# Altium footprint library PCB_Connector.PcbLib: 65 footprints (part 2 of 5)
Each footprint in its own frame and in the unit in brackets; x right, y up, seen from the top. Pads: shape width x height; smd on the part's side, far side on the other; paste and mask are expansions set on the pad; w line width, h text height; cw(c..) or ccw(c..) is an arc to the next point about the centre after c.
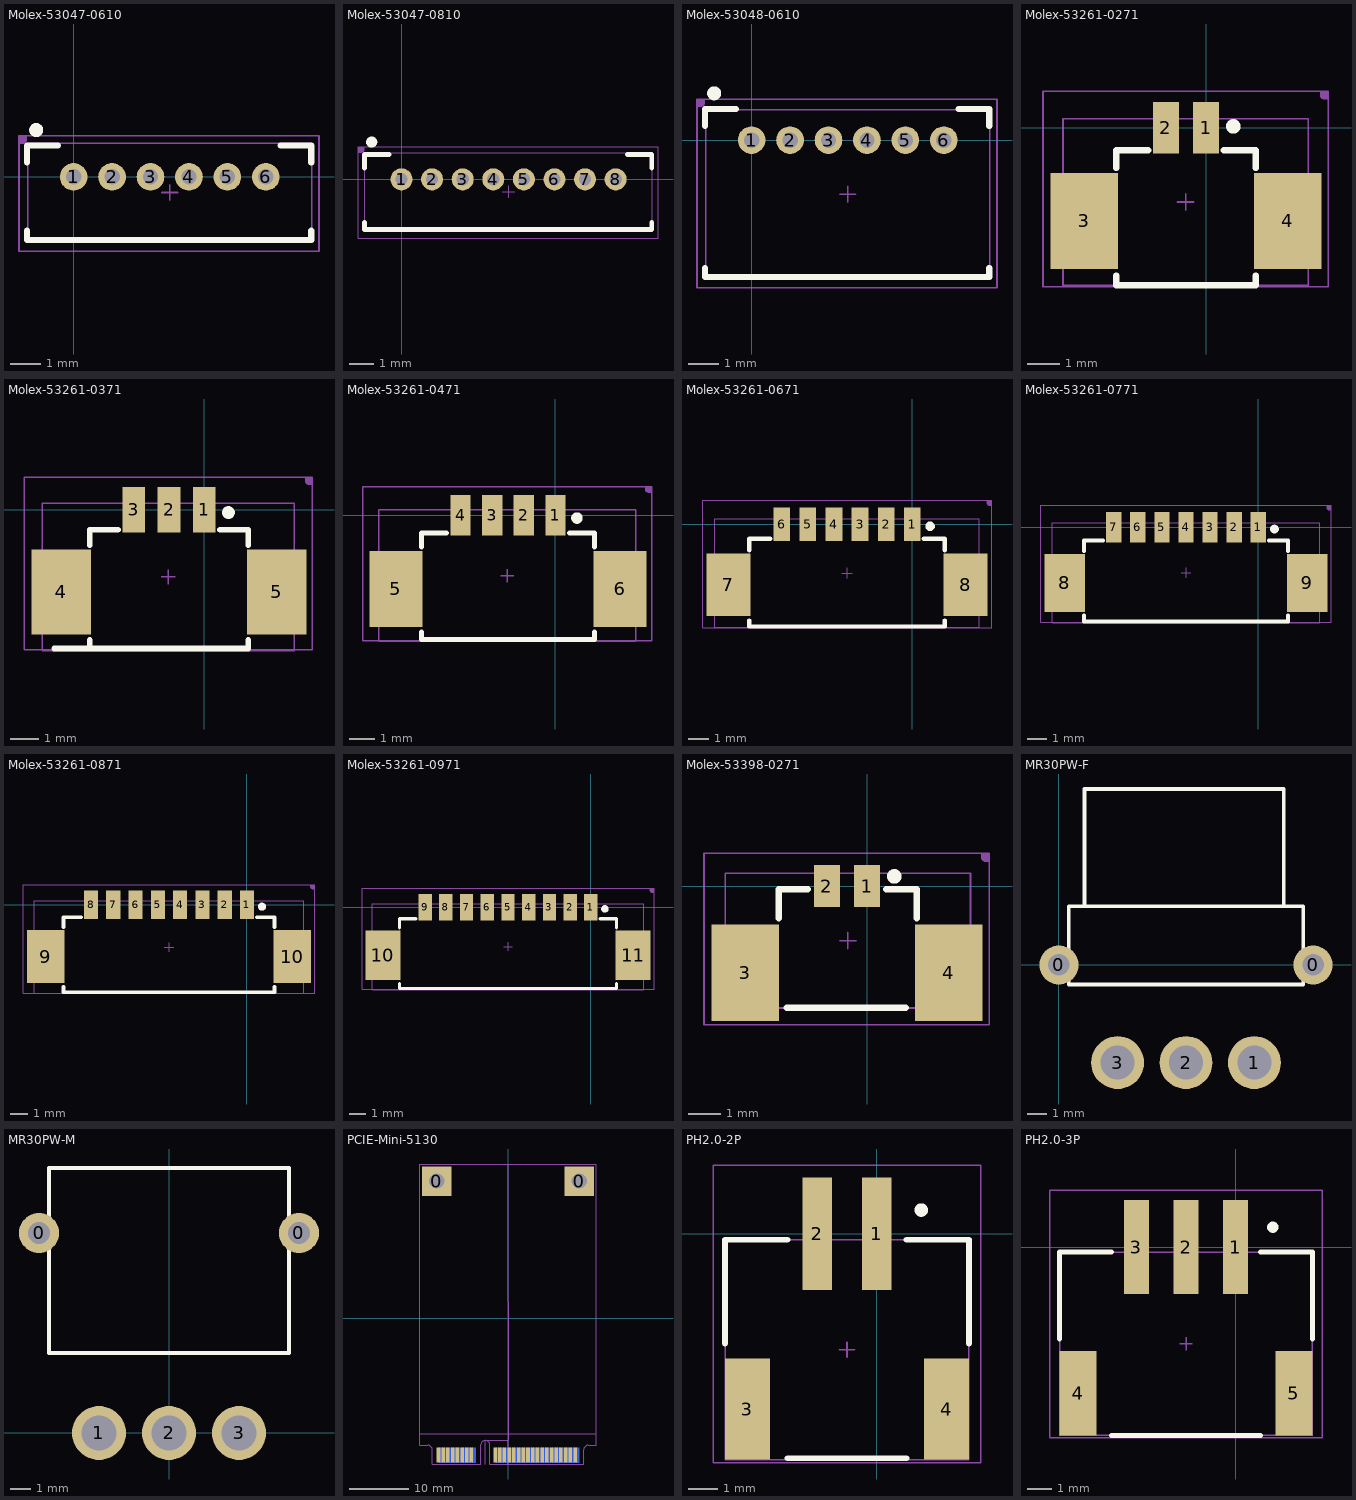
[diagram p1: the footprints below, top view; thin cyan lines are the x and y axes]

## Molex-53047-0610 [mm] "立式1.25mm Pitch PicoBlade Header"
height 3.4
pads (6):
  round 0.9 hole 0.5: 1(0,0) 2(1.25,0) 3(2.5,0) 4(3.75,0) 5(5,0) 6(6.25,0)
Top Overlay:
  circle w0.254: c-1.218,1.524 r0.1
  lines w0.2: -1.516,-1.755 -1.516,-2.055 5.334,-2.055 7.727,-2.055 7.727,-1.755 ; -1.516,0.466 -1.516,1.016 -0.516,1.016 ; 6.727,1.016 7.727,1.016 7.727,0.466
Top Assembly (Mech13):
  lines w0.051: 2.871,-0.508 3.379,-0.508 ; 3.125,-0.762 3.125,-0.254 ; -1.5,-2.108 -1.5,1.092 7.75,1.092 7.75,-2.108 -1.5,-2.108
Top Component:
  region: -1.778,1.333 -1.524,1.333 -1.524,1.206 -1.524,1.181 -1.543,1.135 -1.579,1.099 -1.626,1.079 -1.651,1.079 -1.778,1.079
  lines w0.051: -1.778,-2.413 7.981,-2.413 7.981,1.333 -1.778,1.333 -1.778,-2.413
  text ".Designator" at 1.651,-0.762 h2.03
3D body "530470610.stp": height 4.18, standoff -2.32, extent -1.5,-2.108 7.75,1.092

## Molex-53047-0810 [mm] "立式1.25mm Pitch PicoBlade Header"
height 3.4
pads (8):
  round 0.9 hole 0.5: 1(0,0) 2(1.25,0) 3(2.5,0) 4(3.75,0) 5(5,0) 6(6.25,0) 7(7.5,0) 8(8.75,0)
Top Overlay:
  circle w0.254: c-1.218,1.524 r0.1
  lines w0.2: -1.516,-1.755 -1.516,-2.055 10.227,-2.055 10.227,-1.755 ; -1.516,0.466 -1.516,1.016 -0.516,1.016 ; 9.227,1.016 10.227,1.016 10.227,0.466
Top Assembly (Mech13):
  lines w0.051: 4.121,-0.508 4.629,-0.508 ; 4.375,-0.762 4.375,-0.254 ; -1.5,-2.108 -1.5,1.092 10.25,1.092 10.25,-2.108 -1.5,-2.108
Top Component:
  region: -1.778,1.333 -1.524,1.333 -1.524,1.206 -1.524,1.181 -1.543,1.135 -1.579,1.099 -1.626,1.079 -1.651,1.079 -1.778,1.079
  lines w0.051: -1.778,-2.413 10.481,-2.413 10.481,1.333 -1.778,1.333 -1.778,-2.413
  text ".Designator" at 3.556,-0.864 h2.03
3D body "530470810.stp": height 4.18, standoff -2.32, extent -1.5,-2.108 10.25,1.092

## Molex-53048-0610 [mm] "卧式1.25mm Pitch PicoBlade Header"
height 3.4
pads (6):
  round 0.9 hole 0.5: 1(0,0) 2(1.25,0) 3(2.5,0) 4(3.75,0) 5(5,0) 6(6.25,0)
Top Overlay:
  circle w0.254: c-1.218,1.524 r0.1
  lines w0.2: -1.516,-4.155 -1.516,-4.455 5.334,-4.455 7.727,-4.455 7.727,-4.155 ; -1.516,0.466 -1.516,1.016 -0.516,1.016 ; 6.727,1.016 7.727,1.016 7.727,0.466
Top Assembly (Mech13):
  lines w0.051: 2.871,-1.758 3.379,-1.758 ; 3.125,-2.012 3.125,-1.504 ; -1.5,-4.508 7.75,-4.508 7.75,0.992 -1.5,0.992 -1.5,-4.508
Top Component:
  region: -1.778,1.333 -1.524,1.333 -1.524,1.206 -1.524,1.181 -1.543,1.135 -1.579,1.099 -1.626,1.079 -1.651,1.079 -1.778,1.079
  lines w0.051: -1.778,-4.8 -1.778,1.333 7.981,1.333 7.981,-4.8 -1.778,-4.8
  text ".Designator" at 2,-2 h2.03
3D body "530480610.stp": height 3.6, standoff -2.2, extent -1.5,-4.508 7.75,0.992

## Molex-53261-0271 [mm] "卧式1.25mm Pitch PicoBlade Header"
height 3.4
pads (4):
  rect 0.8x1.6 smd: 1(0,0) 2(-1.25,0)
  rect 2.1x3 smd: 3(-3.8,-2.9) 4(2.55,-2.9)
Top Overlay:
  circle w0.254: c0.85,0.046 r0.1
  lines w0.2: -2.8,-4.6 -2.8,-4.9 1.55,-4.9 1.55,-4.6 ; -2.8,-1.25 -2.8,-0.7 -1.8,-0.7 ; 0.55,-0.7 1.55,-0.7 1.55,-1.25
Top Assembly (Mech13):
  lines w0.051: -0.889,-2.312 -0.381,-2.312 ; -0.635,-2.566 -0.635,-2.058 ; -4.46,-4.912 3.19,-4.912 3.19,0.288 -4.46,0.288 -4.46,-4.912
Top Component:
  region: 3.81,1.143 3.81,0.889 3.683,0.889 3.658,0.889 3.611,0.908 3.575,0.944 3.556,0.991 3.556,1.016 3.556,1.143
  lines w0.051: -5.08,-4.953 -5.08,1.143 3.81,1.143 3.81,-4.953 -5.08,-4.953
  text ".Designator" at -1.905,-2.82 h2.03
3D body "MOLEX-53261-0271.stp": height 3.4, standoff 0, extent -4.46,-4.912 3.19,0.288

## Molex-53261-0371 [mm] "卧式1.25mm Pitch PicoBlade Header"
height 3.4
pads (5):
  rect 0.8x1.6 smd: 1(0,0) 2(-1.25,0) 3(-2.5,0)
  rect 2.1x3 smd: 4(-5.05,-2.9) 5(2.55,-2.9)
Top Overlay:
  circle w0.254: c0.85,-0.1 r0.1
  lines w0.2: -5.3,-4.9 1.55,-4.9 1.55,-4.6 ; -4.05,-4.9 -4.05,-4.6 ; -4.05,-1.25 -4.05,-0.7 -3.05,-0.7 ; 0.55,-0.7 1.55,-0.7 1.55,-1.25
Top Assembly (Mech13):
  lines w0.051: -1.529,-2.375 -1.021,-2.375 ; -1.275,-2.629 -1.275,-2.121 ; -5.725,-4.975 3.175,-4.975 3.175,0.225 -5.725,0.225 -5.725,-4.975
Top Component:
  region: 3.81,1.143 3.81,0.889 3.683,0.889 3.658,0.889 3.611,0.908 3.575,0.944 3.556,0.991 3.556,1.016 3.556,1.143
  lines w0.051: -6.37,-4.953 3.81,-4.953 3.81,1.143 -6.37,1.143 -6.37,-4.953
  text ".Designator" at -2,-2.8 h2.03
3D body "532610371.stp": height 3.4, standoff 0, extent -5.725,-4.975 3.175,0.225

## Molex-53261-0471 [mm] "卧式1.25mm Pitch PicoBlade Header"
height 3.4
pads (6):
  rect 0.8x1.6 smd: 1(0,0) 2(-1.25,0) 3(-2.5,0) 4(-3.75,0)
  rect 2.1x3 smd: 5(-6.3,-2.9) 6(2.55,-2.9)
Top Overlay:
  circle w0.254: c0.85,-0.1 r0.1
  lines w0.2: -5.3,-4.6 -5.3,-4.9 1.55,-4.9 1.55,-4.6 ; -5.3,-1.25 -5.3,-0.7 -4.3,-0.7 ; 0.55,-0.7 1.55,-0.7 1.55,-1.25
Top Assembly (Mech13):
  lines w0.051: -2.154,-2.375 -1.646,-2.375 ; -1.9,-2.629 -1.9,-2.121 ; -6.975,-4.975 -6.975,0.225 3.175,0.225 3.175,-4.975 -6.975,-4.975
Top Component:
  region: 3.81,1.143 3.81,0.889 3.683,0.889 3.658,0.889 3.611,0.908 3.575,0.944 3.556,0.991 3.556,1.016 3.556,1.143
  lines w0.051: -7.62,-4.953 3.81,-4.953 3.81,1.143 -7.62,1.143 -7.62,-4.953
  text ".Designator" at -3.17,-2.883 h2.03
3D body "MOLEX-53261-0471.stp": height 3.4, standoff 0, extent -6.975,-4.975 3.175,0.225

## Molex-53261-0671 [mm] "卧式1.25mm Pitch PicoBlade Header"
height 3.4
pads (8):
  rect 0.8x1.6 smd: 1(0,0) 2(-1.25,0) 3(-2.5,0) 4(-3.75,0) 5(-5,0) 6(-6.25,0)
  rect 2.1x3 smd: 7(-8.8,-2.9) 8(2.55,-2.9)
Top Overlay:
  circle w0.254: c0.85,-0.1 r0.1
  lines w0.2: -7.8,-4.6 -7.8,-4.9 1.55,-4.9 1.55,-4.6 ; -7.8,-1.25 -7.8,-0.7 -6.8,-0.7 ; 0.55,-0.7 1.55,-0.7 1.55,-1.25
Top Assembly (Mech13):
  lines w0.051: -3.378,-2.337 -2.87,-2.337 ; -3.124,-2.591 -3.124,-2.083 ; -9.449,-4.937 -9.449,0.263 3.201,0.263 3.201,-4.937 -9.449,-4.937
Top Component:
  region: 3.81,1.143 3.81,0.889 3.683,0.889 3.658,0.889 3.611,0.908 3.575,0.944 3.556,0.991 3.556,1.016 3.556,1.143
  lines w0.051: -10.033,-4.953 3.81,-4.953 3.81,1.143 -10.033,1.143 -10.033,-4.953
  text ".Designator" at -4.394,-2.845 h2.03
3D body "MOLEX-53261-0671.stp": height 3.4, standoff 0, extent -9.449,-4.937 3.201,0.263

## Molex-53261-0771 [mm] "卧式1.25mm Pitch PicoBlade Header"
height 3.4
pads (9):
  rect 0.8x1.6 smd: 1(0,0) 2(-1.25,0) 3(-2.5,0) 4(-3.75,0) 5(-5,0) 6(-6.25,0) 7(-7.5,0)
  rect 2.1x3 smd: 8(-10.05,-2.9) 9(2.55,-2.9)
Top Overlay:
  circle w0.254: c0.85,-0.1 r0.1
  lines w0.2: -9.05,-4.6 -9.05,-4.9 1.55,-4.9 1.55,-4.6 ; -9.05,-1.25 -9.05,-0.7 -8.05,-0.7 ; 0.55,-0.7 1.55,-0.7 1.55,-1.25
Top Assembly (Mech13):
  lines w0.051: -4.004,-2.375 -3.496,-2.375 ; -3.75,-2.629 -3.75,-2.121 ; -10.7,-4.975 3.2,-4.975 3.2,0.225 -10.7,0.225 -10.7,-4.975
Top Component:
  region: 3.81,1.143 3.81,0.889 3.683,0.889 3.658,0.889 3.611,0.908 3.575,0.944 3.556,0.991 3.556,1.016 3.556,1.143
  lines w0.051: -11.303,-4.953 -11.303,1.143 3.81,1.143 3.81,-4.953 -11.303,-4.953
  text ".Designator" at -5.02,-2.883 h2.03
3D body "MOLEX-53261-0771.stp": height 3.4, standoff 0, extent -10.7,-4.975 3.2,0.225

## Molex-53261-0871 [mm] "卧式1.25mm Pitch PicoBlade Header"
height 3.4
pads (10):
  rect 0.8x1.6 smd: 1(0,0) 2(-1.25,0) 3(-2.5,0) 4(-3.75,0) 5(-5,0) 6(-6.25,0) 7(-7.5,0) 8(-8.75,0)
  rect 2.1x3 smd: 9(-11.3,-2.9) 10(2.55,-2.9)
Top Overlay:
  circle w0.254: c0.85,-0.1 r0.1
  lines w0.2: -10.3,-4.6 -10.3,-4.9 1.55,-4.9 1.55,-4.6 ; -10.3,-1.25 -10.3,-0.7 -9.3,-0.7 ; 0.55,-0.7 1.55,-0.7 1.55,-1.25
Top Assembly (Mech13):
  lines w0.051: -4.629,-2.375 -4.121,-2.375 ; -4.375,-2.629 -4.375,-2.121 ; -11.95,-4.975 3.2,-4.975 3.2,0.225 -11.95,0.225 -11.95,-4.975
Top Component:
  region: 3.81,1.143 3.81,0.889 3.683,0.889 3.658,0.889 3.611,0.908 3.575,0.944 3.556,0.991 3.556,1.016 3.556,1.143
  lines w0.051: -12.553,-4.953 3.81,-4.953 3.81,1.143 -12.553,1.143 -12.553,-4.953
  text ".Designator" at -5.309,-2.87 h2.03
3D body "532610871.stp": height 3.4, standoff 0, extent -11.95,-4.975 3.2,0.225

## Molex-53261-0971 [mm] "卧式1.25mm Pitch PicoBlade Header"
height 3.4
pads (11):
  rect 0.8x1.6 smd: 1(0,0) 2(-1.25,0) 3(-2.5,0) 4(-3.75,0) 5(-5,0) 6(-6.25,0) 7(-7.5,0) 8(-8.75,0) 9(-10,0)
  rect 2.1x3 smd: 10(-12.55,-2.9) 11(2.55,-2.9)
Top Overlay:
  circle w0.254: c0.85,-0.1 r0.1
  lines w0.2: -11.55,-4.6 -11.55,-4.9 1.55,-4.9 1.55,-4.6 ; -11.55,-1.25 -11.55,-0.7 -10.55,-0.7 ; 0.55,-0.7 1.55,-0.7 1.55,-1.25
Top Assembly (Mech13):
  lines w0.051: -5.254,-2.375 -4.746,-2.375 ; -5,-2.629 -5,-2.121 ; -13.2,-4.975 -13.2,0.225 3.2,0.225 3.2,-4.975 -13.2,-4.975
Top Component:
  region: 3.81,1.143 3.81,0.889 3.683,0.889 3.658,0.889 3.611,0.908 3.575,0.944 3.556,0.991 3.556,1.016 3.556,1.143
  lines w0.051: -13.803,-4.953 -13.803,1.143 3.81,1.143 3.81,-4.953 -13.803,-4.953
  text ".Designator" at -5.817,-2.921 h2.03
3D body "532610971.stp": height 3.4, standoff 0, extent -13.2,-4.975 3.2,0.225

## Molex-53398-0271 [mm] "立式1.25mm Pitch PicoBlade Header"
height 3.4
pads (4):
  rect 0.8x1.3 smd: 1(0,0) 2(-1.25,0)
  rect 2.1x3 smd: 3(-3.8,-2.7) 4(2.55,-2.7)
Top Overlay:
  circle w0.254: c0.85,0.3 r0.1
  lines w0.2: -2.75,-1 -2.75,-0.1 -1.85,-0.1 ; -2.5,-3.8 1.2,-3.8 ; 0.6,-0.1 1.55,-0.1 1.55,-1
Top Assembly (Mech13):
  lines w0.051: -0.854,-1.7 -0.346,-1.7 ; -0.6,-1.954 -0.6,-1.446 ; -4.425,-3.8 -4.425,0.4 3.225,0.4 3.225,-3.8 -4.425,-3.8
Top Component:
  region: 3.81,1.016 3.81,0.762 3.683,0.762 3.658,0.762 3.611,0.781 3.575,0.817 3.556,0.864 3.556,0.889 3.556,1.016
  lines w0.051: -5.08,-4.318 3.81,-4.318 3.81,1.016 -5.08,1.016 -5.08,-4.318
  text ".Designator" at -1.87,-2.208 h2.03
3D body "MOLEX-53398-0271.stp": height 4.67, standoff -0.07, extent -4.425,-3.8 3.225,0.4

## MR30PW-F [mm]
pads (5):
  round 2 hole 1.1: 0(0,0) 0(13,0)
  round 2.7 hole 1.75: 1(10,-5) 2(6.5,-5) 3(3,-5)
Top Overlay:
  lines w0.2: 1.3,3 1.3,9 11.5,9 11.5,3 ; 0.5,-1 12.5,-1 12.5,3 0.5,3 0.5,-1
3D body "MR30PW-F 3D DRAWING.STEP": height 4.9, standoff -2.05, extent -1.15,-5.952 14.15,8.948

## MR30PW-M [mm]
pads (5):
  round 2 hole 1.1: 0(-6.5,10) 0(6.5,10)
  round 2.7 hole 1.75: 1(-3.5,0) 2(0,0) 3(3.5,0)
Top Overlay:
  lines w0.2: -6,4 -6,13.25 6,13.25 6,4 -6,4
3D body "MR30PW-M 3D DRAWING.STEP": height 4.9, standoff -2.05, extent -7.65,-0.85 7.65,13.1

## PCIE-Mini-5130 [mm]
pads (54):
  rect 5x5 hole 2.6: 0(-12.1,23.263) 0(12.1,23.263)
  rect 0.6x2.55 smd: 1(-11.802,-23.262) 3(-11.002,-23.262) 5(-10.202,-23.262) 7(-9.402,-23.262) 9(-8.602,-23.262) 11(-7.802,-23.262) 13(-7.002,-23.262) 15(-6.202,-23.262) 17(-2.202,-23.262) 19(-1.402,-23.262) 21(-0.602,-23.262) 23(0.198,-23.262) 25(0.998,-23.262) 27(1.798,-23.262) 29(2.598,-23.262) 31(3.398,-23.262) 33(4.198,-23.262) 35(4.998,-23.262) 37(5.798,-23.262) 39(6.598,-23.262) 41(7.398,-23.262) 43(8.198,-23.262) 45(8.998,-23.262) 47(9.798,-23.262) 49(10.598,-23.262) 51(11.398,-23.262)
  rect 0.6x2.55 smd far side: 2(-11.402,-23.262) 4(-10.602,-23.262) 6(-9.802,-23.262) 8(-9.002,-23.262) 10(-8.202,-23.262) 12(-7.402,-23.262) 14(-6.602,-23.262) 16(-5.802,-23.262) 18(-1.802,-23.262) 20(-1.002,-23.262) 22(-0.202,-23.262) 24(0.598,-23.262) 26(1.398,-23.262) 28(2.198,-23.262) 30(2.998,-23.262) 32(3.798,-23.262) 34(4.598,-23.262) 36(5.398,-23.262) 38(6.198,-23.262) 40(6.998,-23.262) 42(7.798,-23.262) 44(8.598,-23.262) 46(9.398,-23.262) 48(10.198,-23.262) 50(10.998,-23.262) 52(11.798,-23.262)
Top Component:
  lines w0.051: -3.852,-24.787 -3.852,-20.787 cw(c-3.852,-21.538) -3.102,-21.538 -3.102,-24.787 12.85,-24.787 ; 0,26.163 0,-20.788 ; 0,-20.788 0,-24.787 12.85,-24.787 ; 0,-20.788 -3.85,-20.788 ccw(c-3.851,-21.538) -4.602,-21.538 -4.602,-24.787 -12.85,-24.787 -12.85,-22.4 ccw(c-13.65,-22.4) -13.65,-21.6 -15,-21.6 -15,26.163 15,26.163 15,-21.587 13.65,-21.587 ccw(c13.65,-22.387) 12.85,-22.387 12.85,-24.787
Bottom Component:
  lines w0.051: -15,-19.688 0,-19.687 15,-19.687

## PH2.0-2P [mm] "卧式PH2.0mm Pitch Header"
height 3.4
pads (4):
  rect 1x3.8 smd: 1(0,0) 2(-2,0)
  rect 1.5x3.4 smd: 3(-4.35,-5.9) 4(2.35,-5.9)
Top Overlay:
  circle w0.254: c1.5,0.8 r0.1
  lines w0.2: -5.1,-3.7 -5.1,-0.2 -3,-0.2 ; -3,-7.556 1,-7.556 ; 1,-0.2 3.1,-0.2 3.1,-3.7
Top Assembly (Mech13):
  lines w0.051: -1.254,-3.9 -0.746,-3.9 ; -1,-4.154 -1,-3.646 ; -5.1,-7.6 -5.1,-0.2 3.1,-0.2 3.1,-7.6 -5.1,-7.6
Top Component:
  lines w0.051: -5.5,-7.7 -5.5,2.3 3.5,2.3 3.5,1.5 3.5,-7.7 -5.5,-7.7
  text ".Designator" at -2.27,-4.408 h2.03
3D body "S2B-PH-SM4-TB.STEP": height 5.5, standoff -0.1, extent -4.95,-7.6 2.95,1

## PH2.0-3P [mm] "卧式PH2.0mm Pitch Header"
height 3.4
pads (5):
  rect 1x3.8 smd: 1(0,0) 2(-2,0) 3(-4,0)
  rect 1.5x3.4 smd: 4(-6.35,-5.9) 5(2.35,-5.9)
Top Overlay:
  circle w0.254: c1.5,0.8 r0.1
  lines w0.2: -7.1,-3.7 -7.1,-0.2 -5,-0.2 ; -5,-7.6 1,-7.6 ; 1,-0.2 3.1,-0.2 3.1,-3.7
Top Assembly (Mech13):
  lines w0.051: -2.254,-3.9 -1.746,-3.9 ; -2,-4.154 -2,-3.646 ; -7.1,-7.6 -7.1,-0.2 3.1,-0.2 3.1,-7.6 -7.1,-7.6
Top Component:
  lines w0.051: -7.5,-7.7 -7.5,2.3 3.5,2.3 3.5,1.5 3.5,-7.7 -7.5,-7.7
  text ".Designator" at -3.27,-4.408 h2.03
3D body "S3B-PH-SM4-TB.STEP": height 5.5, standoff -0.1, extent -6.95,-7.6 2.95,1